# Altium footprint library xialeste-20221201.PcbLib: 195 footprints (part 9 of 13)
Each footprint in its own frame and in the unit in brackets; x right, y up, seen from the top. Pads: shape width x height; smd on the part's side, far side on the other; paste and mask are expansions set on the pad; w line width, h text height; cw(c..) or ccw(c..) is an arc to the next point about the centre after c.
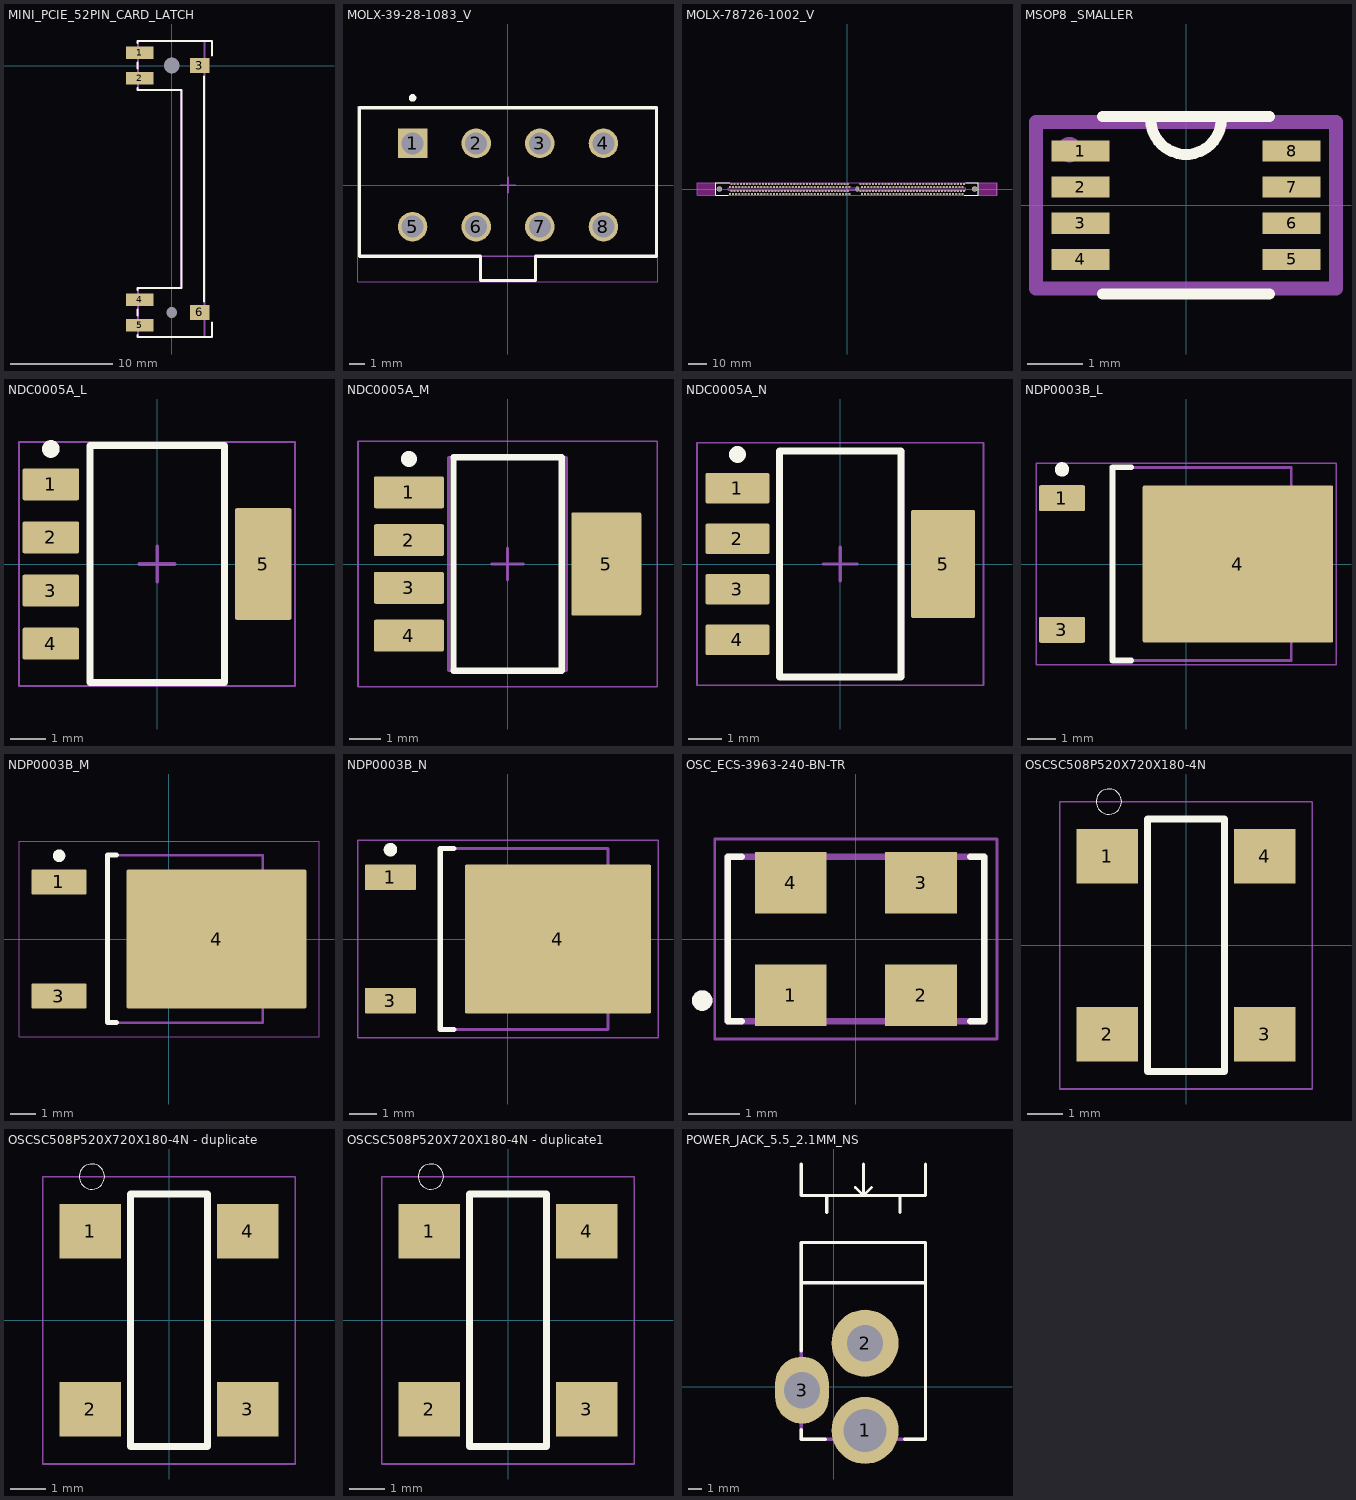
[diagram p8: the footprints below, top view; thin cyan lines are the x and y axes]

## MINI_PCIE_52PIN_CARD_LATCH [mm] "Creator MM"
height 6.8
pads (8):
  rect 2.7x1.2 smd: 1(-3.15,1.25) 2(-3.15,-1.25) 4(-3.15,-22.95) 5(-3.15,-25.45)
  rect 1.9x1.5 smd: 3(2.75,0) 6(2.75,-24.2)
  rrect0% 0x0 hole 1.55: 7(0,0)
  rrect0% 0x0 hole 1.05: 8(0,-24.2)
Top Overlay:
  lines w0.2: -3.35,-26.4 -3.35,-26.6 3.95,-26.6 3.95,-25.2 ; -3.35,-24.5 -3.35,-23.9 ; -3.35,-22 -3.35,-21.8 0.95,-21.8 0.95,-2.4 -3.35,-2.4 -3.35,-2.2 ; -3.35,-0.3 -3.35,0.3 ; -3.35,2.2 -3.35,2.4 3.95,2.4 3.95,1 ; 3.15,-23.1 3.15,-1.1
Mechanical 29:
  lines w0.2: -3.3,-26.6 3.2,-26.6 3.2,2.4 -3.3,2.4 -3.3,-2.4 0.9,-2.4 0.9,-21.8 -3.3,-21.8 -3.3,-26.6
  text ".Designator" at 1.7,-11.1 h1
3D body "K3D-MM60-EZH059-B5-R2 JAE Connector Division Proprietary.STEP": height 6.7, standoff -0.9, extent -3.95,-26.6 3.95,2.4

## MINI_PCIE_FULL CARD [mm] ".Creator MM"
3D body "PCI Express Mini Card (Full-Mini Card).step": height 6.9, standoff 2.15, extent 0,0 50.95,30

## MOLX-39-28-1083_V [mm] "PCB Header, 8-Leads, Vertical, Pitch 4.2 mm, Through Hole"
height 13.1
pads (8):
  rect 1.95x1.95 hole 1.45: 1(-6.3,2.75)
  round 1.95 hole 1.45: 2(-2.1,2.75) 3(2.1,2.75) 4(6.3,2.75) 5(-6.3,-2.75) 6(-2.1,-2.75) 7(2.1,-2.75) 8(6.3,-2.75)
Top Overlay:
  circle w0.25: c-6.3,5.75 r0.125
  lines w0.2: -9.8,-4.7 -9.8,5.1 9.8,5.1 9.8,-4.7 1.8,-4.7 1.8,-6.3 -1.8,-6.3 -1.8,-4.7 -9.8,-4.7
Mechanical 13:
  lines w0.1: -1.8,-4.7 -1.8,-6.3 1.8,-6.3 1.8,-4.7 ; -9.8,-4.7 9.8,-4.7 9.8,5.1 -9.8,5.1 -9.8,-4.7
Mechanical 15:
  lines w0.05: -9.9,-6.4 9.9,-6.4 9.9,5.2 -9.9,5.2 -9.9,-6.4
  lines w0.1: -0.5,0 0.5,0 ; 0,-0.5 0,0.5
3D body "039281083.stp": height 12.8, standoff -3.5, extent -9.4,-6 9.4,5

## MOLX-78726-1002_V [mm] "DIMM, 288-Leads, Body 162x6.5mm, Pitch 0.85mm"
height 20.53
pads (291):
  rect 1.2x1.2 hole 0.66: 1(-63.325,-2.7)
  round 1.2 hole 0.66: 2(-62.475,-1.1) 3(-61.625,-2.7) 4(-60.775,-1.1) 5(-59.925,-2.7) 6(-59.075,-1.1) 7(-58.225,-2.7) 8(-57.375,-1.1) 9(-56.525,-2.7) 10(-55.675,-1.1) 11(-54.825,-2.7) 12(-53.975,-1.1) 13(-53.125,-2.7) 14(-52.275,-1.1) 15(-51.425,-2.7) 16(-50.575,-1.1) 17(-49.725,-2.7) 18(-48.875,-1.1) 19(-48.025,-2.7) 20(-47.175,-1.1) 21(-46.325,-2.7) 22(-45.475,-1.1) 23(-44.625,-2.7) 24(-43.775,-1.1) 25(-42.925,-2.7) 26(-42.075,-1.1) 27(-41.225,-2.7) 28(-40.375,-1.1) 29(-39.525,-2.7) 30(-38.675,-1.1) 31(-37.825,-2.7) 32(-36.975,-1.1) 33(-36.125,-2.7) 34(-35.275,-1.1) 35(-34.425,-2.7) 36(-33.575,-1.1) 37(-32.725,-2.7) 38(-31.875,-1.1) 39(-31.025,-2.7) 40(-30.175,-1.1) 41(-29.325,-2.7) 42(-28.475,-1.1) 43(-27.625,-2.7) 44(-26.775,-1.1) 45(-25.925,-2.7) 46(-25.075,-1.1) 47(-24.225,-2.7) 48(-23.375,-1.1) 49(-22.525,-2.7) 50(-21.675,-1.1) 51(-20.825,-2.7) 52(-19.975,-1.1) 53(-19.125,-2.7) 54(-18.275,-1.1) 55(-17.425,-2.7) 56(-16.575,-1.1) 57(-15.725,-2.7) 58(-14.875,-1.1) 59(-14.025,-2.7) 60(-13.175,-1.1) 61(-12.325,-2.7) 62(-11.475,-1.1) 63(-10.625,-2.7) 64(-9.775,-1.1) 65(-8.925,-2.7) 66(-8.075,-1.1) 67(-7.225,-2.7) 68(-6.375,-1.1) 69(-5.525,-2.7) 70(-4.675,-1.1) 71(-3.825,-2.7) 72(-2.975,-1.1) 73(-2.125,-2.7) 74(-1.275,-1.1) 75(-0.425,-2.7) 76(0.425,-1.1) 77(1.275,-2.7) 78(7.225,-1.1) 79(8.075,-2.7) 80(8.925,-1.1) 81(9.775,-2.7) 82(10.625,-1.1) 83(11.475,-2.7) 84(12.325,-1.1) 85(13.175,-2.7) 86(14.025,-1.1) 87(14.875,-2.7) 88(15.725,-1.1) 89(16.575,-2.7) 90(17.425,-1.1) 91(18.275,-2.7) 92(19.125,-1.1) 93(19.975,-2.7) 94(20.825,-1.1) 95(21.675,-2.7) 96(22.525,-1.1) 97(23.375,-2.7) 98(24.225,-1.1) 99(25.075,-2.7) 100(25.925,-1.1) 101(26.775,-2.7) 102(27.625,-1.1) 103(28.475,-2.7) 104(29.325,-1.1) 105(30.175,-2.7) 106(31.025,-1.1) 107(31.875,-2.7) 108(32.725,-1.1) 109(33.575,-2.7) 110(34.425,-1.1) 111(35.275,-2.7) 112(36.125,-1.1) 113(36.975,-2.7) 114(37.825,-1.1) 115(38.675,-2.7) 116(39.525,-1.1) 117(40.375,-2.7) 118(41.225,-1.1) 119(42.075,-2.7) 120(42.925,-1.1) 121(43.775,-2.7) 122(44.625,-1.1) 123(45.475,-2.7) 124(46.325,-1.1) 125(47.175,-2.7) 126(48.025,-1.1) 127(48.875,-2.7) 128(49.725,-1.1) 129(50.575,-2.7) 130(51.425,-1.1) 131(52.275,-2.7) 132(53.125,-1.1) 133(53.975,-2.7) 134(54.825,-1.1) 135(55.675,-2.7) 136(56.525,-1.1) 137(57.375,-2.7) 138(58.225,-1.1) 139(59.075,-2.7) 140(59.925,-1.1) 141(60.775,-2.7) 142(61.625,-1.1) 143(62.475,-2.7) 144(63.325,-1.1) 145(-63.325,1.1) 146(-62.475,2.7) 147(-61.625,1.1) 148(-60.775,2.7) 149(-59.925,1.1) 150(-59.075,2.7) 151(-58.225,1.1) 152(-57.375,2.7) 153(-56.525,1.1) 154(-55.675,2.7) 155(-54.825,1.1) 156(-53.975,2.7) 157(-53.125,1.1) 158(-52.275,2.7) 159(-51.425,1.1) 160(-50.575,2.7) 161(-49.725,1.1) 162(-48.875,2.7) 163(-48.025,1.1) 164(-47.175,2.7) 165(-46.325,1.1) 166(-45.475,2.7) 167(-44.625,1.1) 168(-43.775,2.7) 169(-42.925,1.1) 170(-42.075,2.7) 171(-41.225,1.1) 172(-40.375,2.7) 173(-39.525,1.1) 174(-38.675,2.7) 175(-37.825,1.1) 176(-36.975,2.7) 177(-36.125,1.1) 178(-35.275,2.7) 179(-34.425,1.1) 180(-33.575,2.7) 181(-32.725,1.1) 182(-31.875,2.7) 183(-31.025,1.1) 184(-30.175,2.7) 185(-29.325,1.1) 186(-28.475,2.7) 187(-27.625,1.1) 188(-26.775,2.7) 189(-25.925,1.1) 190(-25.075,2.7) 191(-24.225,1.1) 192(-23.375,2.7) 193(-22.525,1.1) 194(-21.675,2.7) 195(-20.825,1.1) 196(-19.975,2.7) 197(-19.125,1.1) 198(-18.275,2.7) 199(-17.425,1.1) 200(-16.575,2.7) 201(-15.725,1.1) 202(-14.875,2.7) 203(-14.025,1.1) 204(-13.175,2.7) 205(-12.325,1.1) 206(-11.475,2.7) 207(-10.625,1.1) 208(-9.775,2.7) 209(-8.925,1.1) 210(-8.075,2.7) 211(-7.225,1.1) 212(-6.375,2.7) 213(-5.525,1.1) 214(-4.675,2.7) 215(-3.825,1.1) 216(-2.975,2.7) 217(-2.125,1.1) 218(-1.275,2.7) 219(-0.425,1.1) 220(0.425,2.7) 221(1.275,1.1) 222(7.225,2.7) 223(8.075,1.1) 224(8.925,2.7) 225(9.775,1.1) 226(10.625,2.7) 227(11.475,1.1) 228(12.325,2.7) 229(13.175,1.1) 230(14.025,2.7) 231(14.875,1.1) 232(15.725,2.7) 233(16.575,1.1) 234(17.425,2.7) 235(18.275,1.1) 236(19.125,2.7) 237(19.975,1.1) 238(20.825,2.7) 239(21.675,1.1) 240(22.525,2.7) 241(23.375,1.1) 242(24.225,2.7) 243(25.075,1.1) 244(25.925,2.7) 245(26.775,1.1) 246(27.625,2.7) 247(28.475,1.1) 248(29.325,2.7) 249(30.175,1.1) 250(31.025,2.7) 251(31.875,1.1) 252(32.725,2.7) 253(33.575,1.1) 254(34.425,2.7) 255(35.275,1.1) 256(36.125,2.7) 257(36.975,1.1) 258(37.825,2.7) 259(38.675,1.1) 260(39.525,2.7) 261(40.375,1.1) 262(41.225,2.7) 263(42.075,1.1) 264(42.925,2.7) 265(43.775,1.1) 266(44.625,2.7) 267(45.475,1.1) 268(46.325,2.7) 269(47.175,1.1) 270(48.025,2.7) 271(48.875,1.1) 272(49.725,2.7) 273(50.575,1.1) 274(51.425,2.7) 275(52.275,1.1) 276(53.125,2.7) 277(53.975,1.1) 278(54.825,2.7) 279(55.675,1.1) 280(56.525,2.7) 281(57.375,1.1) 282(58.225,2.7) 283(59.075,1.1) 284(59.925,2.7) 285(60.775,1.1) 286(61.625,2.7) 287(62.475,1.1) 288(63.325,2.7)
  oval 1.7x2.95 hole 1.2 slot 2.45 at 90 deg: MH1(5.575,0)
  round 2.95 hole 2.45: MH2(-68.975,0) MH3(68.975,0)
Top Layer keep-out:
  rectangle: -81,-3.25 -71,3.25
  rectangle: 71,-3.25 81,3.25
Top Overlay:
  lines w0.2: -64.325,-3.25 -71,-3.25 -71,3.25 -63.31,3.25 ; 63.31,-3.25 71,-3.25 71,3.25 64.16,3.25
Mechanical 13:
  lines w0.1: 4.875,-0.79 4.875,0.79 ; 6.275,-0.79 6.275,0.79 ; -71,-3.25 -81,-3.25 -81,3.25 -71,3.25 ; -71,-3.25 -71,3.25 ; -71,-3.25 71,-3.25 ; -71,3.25 71,3.25 ; 71,-3.25 71,3.25 ; 71,-3.25 81,-3.25 81,3.25 71,3.25 ; -64.3,-0.79 -64.3,0.79 64.3,0.79 64.3,-0.79 -64.3,-0.79
Mechanical 15:
  lines w0.05: -81.1,-3.4 -81.1,3.4 81.1,3.4 81.1,-3.4 -81.1,-3.4
  lines w0.1: -0.5,0 0.5,0 ; 0,-0.5 0,0.5
3D body: height 6.05, standoff 2.4, extent 4.875,-0.79 6.275,0.79
3D body: height 6.3, standoff 0, extent -71,-3.25 71,3.25
3D body: height 2.4, standoff 0, extent -64.3,-0.79 64.3,0.79
3D body: height 20.53, standoff 5, extent -81,-3.25 -64.3,3.25
3D body: height 14, standoff 5, extent 64.3,-3.25 81,3.25

## MSOP8 _SMALLER [mm]
pads (8):
  rect 1.04x0.38 smd mask+0.076: 1(-1.9,0.975) 2(-1.9,0.325) 3(-1.9,-0.325) 4(-1.9,-0.975) 5(1.9,-0.975) 6(1.9,-0.325) 7(1.9,0.325) 8(1.9,0.975)
Top Overlay:
  lines w0.2: -1.5,-1.6 1.5,-1.6 ; -1.5,1.6 1.5,1.6 ; -0.635,1.549 ccw(c0,1.549) 0.635,1.549
Mechanical 29:
  circle w0.254: c-2.1,1 r0.1
  lines w0.254: -2.7,-1.5 2.7,-1.5 2.7,1.5 -2.7,1.5 -2.7,-1.5
  text ".Designator" at 1,0.4 h1
3D body: height 0.9, standoff 0, extent -1.5,-1.6 1.5,1.6

## NDC0005A_L [mm] "SOT223, 5-Leads, Body 6.7x3.71mm, Pitch 1.5mm, IPC High Density"
height 1.8
pads (5):
  rrect11% 1.6x0.9 smd: 1(-3,2.25) 2(-3,0.75) 3(-3,-0.75) 4(-3,-2.25)
  rrect6% 1.6x3.15 smd: 5(3,0)
Top Overlay:
  circle w0.25: c-3,3.25 r0.125
  lines w0.2: -1.9,-3.35 1.9,-3.35 1.9,3.35 -1.9,3.35 -1.9,-3.35
Mechanical 1:
  text ".Designator" at -1.651,-0.381 h0.9
Mechanical 13:
  lines w0.1: -1.855,-3.35 1.855,-3.35 1.855,3.35 -1.855,3.35 -1.855,-3.35
Mechanical 15:
  lines w0.05: -3.9,-3.45 3.9,-3.45 3.9,3.45 -3.9,3.45 -3.9,-3.45
  lines w0.1: -0.5,0 0.5,0 ; 0,-0.5 0,0.5
3D body "NDC0005A.stp": height 1.7, standoff 0.02, extent -3.482,-3.25 3.482,3.25

## NDC0005A_M [mm] "SOT223, 5-Leads, Body 6.7x3.71mm, Pitch 1.5mm, IPC Low Density"
height 1.8
pads (5):
  rrect10% 2.2x1 smd: 1(-3.1,2.25) 2(-3.1,0.75) 3(-3.1,-0.75) 4(-3.1,-2.25)
  rrect5% 2.2x3.25 smd: 5(3.1,0)
Top Overlay:
  circle w0.25: c-3.1,3.3 r0.125
  lines w0.2: -1.7,-3.35 1.7,-3.35 1.7,3.35 -1.7,3.35 -1.7,-3.35
Mechanical 1:
  text ".Designator" at -1.524,-0.381 h0.8
Mechanical 13:
  lines w0.1: -1.855,-3.35 1.855,-3.35 1.855,3.35 -1.855,3.35 -1.855,-3.35
Mechanical 15:
  lines w0.05: -4.7,-3.85 4.7,-3.85 4.7,3.85 -4.7,3.85 -4.7,-3.85
  lines w0.1: -0.5,0 0.5,0 ; 0,-0.5 0,0.5
3D body "NDC0005A.stp": height 1.7, standoff 0.02, extent -3.482,-3.25 3.482,3.25

## NDC0005A_N [mm] "SOT223, 5-Leads, Body 6.7x3.71mm, Pitch 1.5mm, IPC Medium Density"
height 1.8
pads (5):
  rrect11% 1.9x0.9 smd: 1(-3.05,2.25) 2(-3.05,0.75) 3(-3.05,-0.75) 4(-3.05,-2.25)
  rrect5% 1.9x3.2 smd: 5(3.05,0)
Top Overlay:
  circle w0.25: c-3.05,3.25 r0.125
  lines w0.2: -1.8,-3.35 1.8,-3.35 1.8,3.35 -1.8,3.35 -1.8,-3.35
Mechanical 1:
  text ".Designator" at -1.524,-0.381 h0.8
Mechanical 13:
  lines w0.1: -1.855,-3.35 1.855,-3.35 1.855,3.35 -1.855,3.35 -1.855,-3.35
Mechanical 15:
  lines w0.05: -4.25,-3.6 4.25,-3.6 4.25,3.6 -4.25,3.6 -4.25,-3.6
  lines w0.1: -0.5,0 0.5,0 ; 0,-0.5 0,0.5
3D body "NDC0005A.stp": height 1.7, standoff 0.02, extent -3.482,-3.25 3.482,3.25

## NDP0003B_L [mm] "D-PAK, 4-Leads, Body 6.1x6.6mm, Pitch 2.29mm, Lead Span 9.7mm, IPC High Density"
height 2.38
pads (3):
  rrect11% 1.6x0.9 smd: 1(-4.3,2.28) 3(-4.3,-2.28)
  rrect2% 6.6x5.45 smd: 4(1.8,0)
Top Overlay:
  circle w0.25: c-4.3,3.28 r0.125
  lines w0.2: -1.9,-3.35 -2.55,-3.35 -2.55,3.35 -1.9,3.35
Mechanical 1:
  text ".Designator" at -1.524,-0.508 h1.02
Mechanical 13:
  lines w0.1: -2.55,-3.35 -2.55,3.35 3.65,3.35 3.65,-3.35 -2.55,-3.35
Mechanical 15:
  lines w0.05: -5.2,-3.5 -5.2,3.5 5.2,3.5 5.2,-3.5 -5.2,-3.5
  lines w0.1: -0.5,0 0.5,0 ; 0,-0.5 0,0.5
3D body "DPAK.step": height 2.51, standoff 0, extent -4.995,-2.999 5.524,3.096

## NDP0003B_M [mm] "D-PAK, 4-Leads, Body 6.1x6.6mm, Pitch 2.29mm, Lead Span 9.7mm, IPC Low Density"
height 2.38
pads (3):
  rrect10% 2.2x1 smd: 1(-4.4,2.28) 3(-4.4,-2.28)
  rrect2% 7.2x5.55 smd: 4(1.9,0)
Top Overlay:
  circle w0.25: c-4.4,3.33 r0.125
  lines w0.2: -2.1,-3.35 -2.45,-3.35 -2.45,3.35 -2.1,3.35
Mechanical 1:
  text ".Designator" at -1.524,-0.508 h1.02
Mechanical 13:
  lines w0.1: -2.45,-3.35 -2.45,3.35 3.75,3.35 3.75,-3.35 -2.45,-3.35
Mechanical 15:
  lines w0.05: -6,-3.9 -6,3.9 6,3.9 6,-3.9 -6,-3.9
  lines w0.1: -0.5,0 0.5,0 ; 0,-0.5 0,0.5
3D body "DPAK.step": height 2.51, standoff 0, extent -5.249,-2.999 5.271,3.096

## NDP0003B_N [mm] "D-PAK, 4-Leads, Body 6.1x6.6mm, Pitch 2.29mm, Lead Span 9.7mm, IPC Medium Density"
height 2.38
pads (3):
  rrect11% 1.9x0.95 smd: 1(-4.35,2.28) 3(-4.35,-2.28)
  rrect2% 6.9x5.5 smd: 4(1.85,0)
Top Overlay:
  circle w0.25: c-4.35,3.305 r0.125
  lines w0.2: -2,-3.35 -2.5,-3.35 -2.5,3.35 -2,3.35
Mechanical 1:
  text ".Designator" at -1.524,-0.508 h1.02
Mechanical 13:
  lines w0.1: -2.5,-3.35 3.7,-3.35 3.7,3.35 -2.5,3.35 -2.5,-3.35
Mechanical 15:
  lines w0.05: -5.55,-3.65 5.55,-3.65 5.55,3.65 -5.55,3.65 -5.55,-3.65
  lines w0.1: -0.5,0 0.5,0 ; 0,-0.5 0,0.5
3D body "DPAK.step": height 2.51, standoff 0, extent -5.249,-2.999 5.271,3.096

## OSC_ECS-3963-240-BN-TR [mm]
pads (4):
  rect 1.4x1.2 smd: 1(-1.27,-1.1) 2(1.27,-1.1) 3(1.27,1.1) 4(-1.27,1.1)
Top Overlay:
  circle w0.2: c-3,-1.2 r0.1
  lines w0.127: -2.224,-1.6 -2.5,-1.6 -2.5,1.6 -2.224,1.6 ; 2.224,-1.6 2.5,-1.6 2.5,1.6 2.224,1.6
Mechanical 13:
  circle w0.2: c-3,-1.2 r0.1
  lines w0.127: -2.5,-1.6 2.5,-1.6 2.5,1.6 -2.5,1.6 -2.5,-1.6
Mechanical 15:
  lines w0.05: -2.75,-1.95 2.75,-1.95 2.75,1.95 -2.75,1.95 -2.75,-1.95
3D body "step_temp.STEP": height 1.3, standoff 0, extent -2.5,-1.6 2.5,1.6

## OSCSC508P520X720X180-4N [mm]
pads (4):
  rect 1.75x1.55 smd: 1(-2.25,2.54) 2(-2.25,-2.54) 3(2.25,-2.54) 4(2.25,2.54)
Top Overlay:
  circle w0: c-2.2,4.1 r0.361
  lines w0.2: -1.1,-3.6 1.1,-3.6 1.1,3.6 -1.1,3.6 -1.1,-3.6
Mechanical 15:
  lines w0.05: -3.6,-4.1 3.6,-4.1 3.6,4.1 -3.6,4.1 -3.6,-4.1
3D body "C3391-100_000_CRX.step": height 1.81, standoff 0, extent -2.604,-3.594 2.604,3.594

## OSCSC508P520X720X180-4N - duplicate [mm]
pads (4):
  rect 1.75x1.55 smd: 1(-2.25,2.54) 2(-2.25,-2.54) 3(2.25,-2.54) 4(2.25,2.54)
Top Overlay:
  circle w0: c-2.2,4.1 r0.361
  lines w0.2: -1.1,-3.6 1.1,-3.6 1.1,3.6 -1.1,3.6 -1.1,-3.6
Mechanical 15:
  lines w0.05: -3.6,-4.1 3.6,-4.1 3.6,4.1 -3.6,4.1 -3.6,-4.1

## OSCSC508P520X720X180-4N - duplicate1 [mm]
pads (4):
  rect 1.75x1.55 smd: 1(-2.25,2.54) 2(-2.25,-2.54) 3(2.25,-2.54) 4(2.25,2.54)
Top Overlay:
  circle w0: c-2.2,4.1 r0.361
  lines w0.2: -1.1,-3.6 1.1,-3.6 1.1,3.6 -1.1,3.6 -1.1,-3.6
Mechanical 15:
  lines w0.05: -3.6,-4.1 3.6,-4.1 3.6,4.1 -3.6,4.1 -3.6,-4.1

## POWER_JACK_5.5_2.1MM_NS [mm]
pads (3):
  round 5 hole 3.2: 1(2.35,-3.25)
  round 5 hole 2.7: 2(2.35,3.25)
  oval 4x5 hole 2.7: 3(-2.35,-0.25)
Top Overlay:
  lines w0.2: 1.625,14.85 2.225,14.25 ; 2.225,16.6 2.225,14.25 ; 2.825,14.85 2.225,14.25
  lines w0.254: -2.4,-3.2 -2.4,-3.9 -0.6,-3.9 ; -2.4,2.7 -2.4,10.75 6.85,10.75 6.85,-3.9 5.3,-3.9 ; -2.4,7.75 6.85,7.75 ; -2.4,16.6 -2.4,14.25 6.85,14.25 6.85,16.6 ; -0.5,13 -0.5,14.25 ; 4.95,13 4.95,14.25
Mechanical 29:
  lines w0.254: -2.4,-3.9 6.85,-3.9 6.85,10.75 -2.4,10.75 -2.4,-3.9
  text ".Designator" at -0.27,1.34 h1.52
3D body "CUI-PJ-002AH.step": height 11, standoff -3.5, extent -2.55,-3.9 6.85,10.5